# Altium footprint library PCBLIB.PcbLib: 775 footprints (part 27 of 49)
Each footprint in its own frame and in the unit in brackets; x right, y up, seen from the top. Pads: shape width x height; smd on the part's side, far side on the other; paste and mask are expansions set on the pad; w line width, h text height; cw(c..) or ccw(c..) is an arc to the next point about the centre after c.
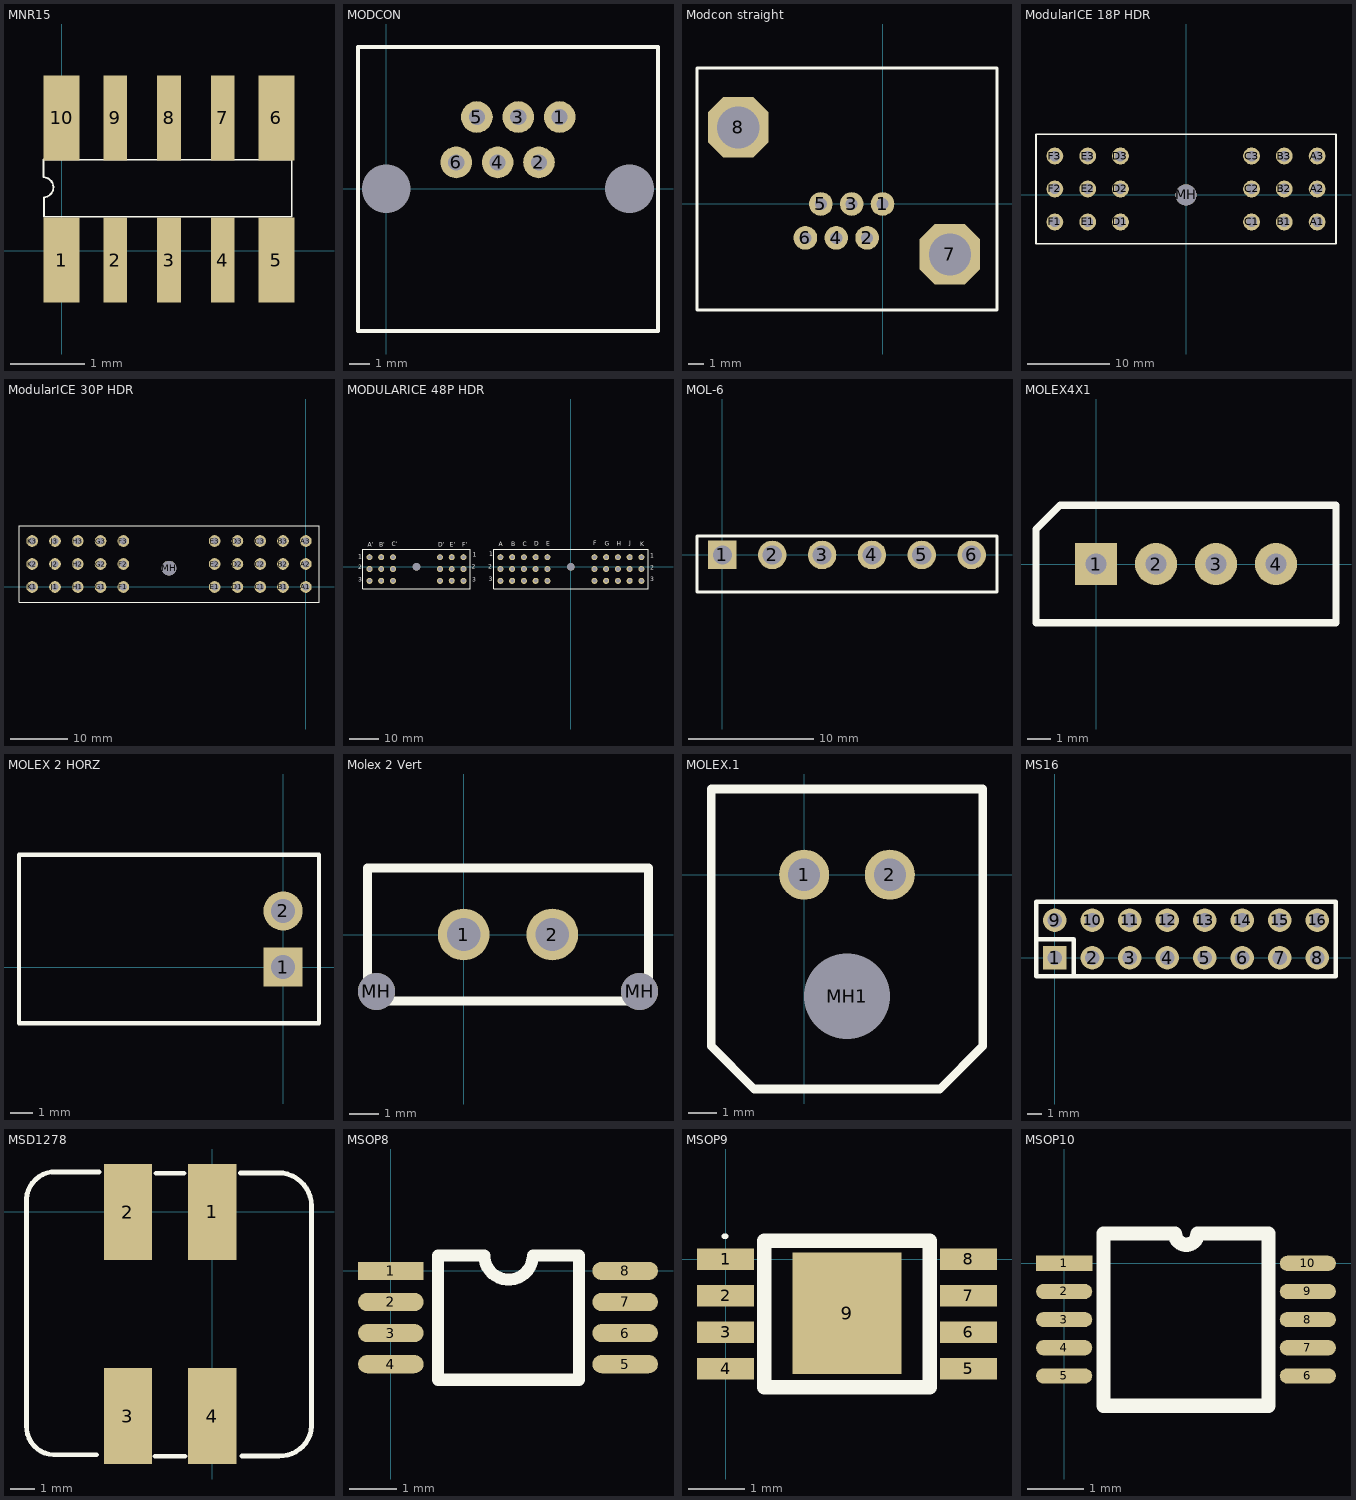
[diagram p26: the footprints below, top view; thin cyan lines are the x and y axes]

## MNR15 [mil]
pads (10):
  rect 18.9x45 smd: 1(0,-5) 5(113.38,-5) 6(113.38,70) 10(0,70)
  rect 12.6x45 smd: 2(28.35,-5) 3(56.69,-5) 4(85.04,-5) 7(85.04,70) 8(56.69,70) 9(28.35,70)
TopOverlay:
  lines w1: -9.56,47.96 121.44,47.96 ; -9.54,47.99 -9.54,38.74 cw(c-9.7,33.4) -9.27,28.08 ; -9.28,28.09 -9.27,17.85 100.81,17.86 ; 99.17,17.87 121.5,17.87 121.48,47.99

## MODCON [mm]
pads (8):
  rect 0x0 hole 2.4: 0(0,0) 0(12,0)
  round 1.562 hole 0.8: 1(8.55,3.54) 2(7.53,1.3) 3(6.51,3.54) 4(5.49,1.3) 5(4.47,3.54) 6(3.45,1.3)
TopOverlay:
  lines w0.203: -1.397,-7.01 -1.397,6.99 13.403,6.99 13.403,-7.01 -1.397,-7.01

## Modcon straight [mm]
pads (8):
  round 1.562 hole 0.8: 1(0,0) 2(-1.02,-2.24) 3(-2.04,0) 4(-3.06,-2.24) 5(-4.08,0) 6(-5.1,-2.24)
  oct 4x4 hole 2.8: 7(4.46,-3.34) 8(-9.54,5.06)
TopOverlay:
  lines w0.203: -12.268,-7.01 -12.268,8.992 7.569,8.992 7.569,-7.01 -12.268,-7.01

## ModularICE 18P HDR [mil]
pads (19):
  round 80 hole 50: A1(623.99,-129) A2(623.99,28.01) A3(623.99,185.02) B1(468.01,-129) B2(468.01,28.01) B3(468.01,185.02) C1(311.98,-129) C2(311.98,28.01) C3(311.98,185.02) D1(-311.99,-129) D2(-311.99,28.01) D3(-311.99,185.02) E1(-468.02,-129) E3(-468.02,185.02) F1(-624,-129) F2(-624,28.01) F3(-624,185.02)
  round 80 hole 50 mask+4.02: E2(-468.02,28.01)
  round 100 hole 100: MH(0,0)
TopOverlay:
  lines w7.99: 713.99,-233.02 713.99,288.99
  lines w8: 713.99,-233 -714,-233 -714,289 713.99,289

## ModularICE 30P HDR [mil]
pads (31):
  round 80 hole 50: A1(0,0) A2(0,157) A3(0,314) B1(-156,0) B2(-156,157) B3(-156,314) C1(-312,0) C2(-312,157) C3(-312,314) D1(-468,0) D2(-468,157) D3(-468,314) E1(-624,0) E2(-624,157) E3(-624,314) F1(-1248,0) F2(-1248,157) F3(-1248,314) G1(-1404,0) G3(-1404,314) H1(-1560,0) H2(-1560,157) H3(-1560,314) J1(-1716,0) J2(-1716,157) J3(-1716,314) K1(-1872,0) K2(-1872,157) K3(-1872,314)
  round 80 hole 50 mask+4: G2(-1404,157)
  round 100 hole 100: MH(-936,129)
TopOverlay:
  lines w8: -1962,-104 -1962,418 90,418 90,-104 -1962,-104

## MODULARICE 48P HDR [mil]
pads (50):
  round 80 hole 50: A1(-936,129.02) A2(-936,-27.99) A3(-936,-185) A'1(-2674.01,129.02) A'2(-2674.01,-27.99) A'3(-2674.01,-185) B1(-780,129.02) B2(-780,-27.99) B3(-780,-185) B'1(-2518.02,129.02) B'3(-2518.02,-185) C1(-624,129.02) C2(-624,-27.99) C3(-624,-185) C'1(-2362,129.02) C'2(-2362,-27.99) C'3(-2362,-185) D1(-468,129.02) D3(-468,-185) D'1(-1738,129.02) D'2(-1738,-27.99) D'3(-1738,-185) E1(-312,129.02) E2(-312,-27.99) E3(-312,-185) E'1(-1581.98,129.02) E'2(-1581.98,-27.99) E'3(-1581.98,-185) F1(312,129.02) F2(312,-27.99) F3(312,-185) F'1(-1425.99,129.02) F'2(-1425.99,-27.99) F'3(-1425.99,-185) G1(468,129.02) G2(468,-27.99) G3(468,-185) H1(624,129.02) H2(624,-27.99) H3(624,-185) J1(780,129.02) J2(780,-27.99) J3(780,-185) K1(936,129.02) K2(936,-27.99) K3(936,-185)
  round 80 hole 50 mask+4.02: B'2(-2518.02,-27.99)
  round 80 hole 50 mask+4: D2(-468,-27.99)
  round 100 hole 100: MH(-2050,0) MH(0,0)
TopOverlay:
  lines w7.99: -1336.01,-289.02 -1336.01,232.99
  lines w8: -1336.01,-289 -2764,-289 -2764,233 -1336.01,233 ; -1026,-289 -1026,233 1026,233 1026,-289 -1026,-289
  text "3" at 1054.32,-213.19 h100
  text "3" at -1092.43,-211.13 h100
  text "3" at -1311.33,-215.35 h100
  text "3" at -2826.51,-215.41 h100
  text "1" at -1303.16,114.31 h100
  text "1" at -1086.27,118.48 h100
  text "1" at 1056.37,101.47 h100
  text "2" at 1054.38,-56.69 h100
  text "2" at -1094.49,-43.96 h100
  text "2" at -1313.44,-41.85 h100
  text "2" at -2822.17,-48.41 h100
  text "1" at -2820.29,86.91 h100
  text "A" at -954.58,253.82 h100
  text "B" at -792.03,253.87 h100
  text "C" at -639.93,255.93 h100
  text "D" at -483.71,260.09 h100
  text "E" at -327.21,260.15 h100
  text "F" at 299.88,266.54 h100
  text "G" at 450.27,260.15 h100
  text "H" at 608.48,262.2 h100
  text "J" at 773.09,266.49 h100
  text "K" at 919.26,253.76 h100
  text "F'" at -1445.14,247.42 h100
  text "E'" at -1607.5,245.37 h100
  text "D'" at -1763.69,245.37 h100
  text "C'" at -2378.2,253.59 h100
  text "B'" at -2544.67,249.48 h100
  text "A'" at -2694.7,249.48 h100
BottomOverlay:
  text "1" at 1070.79,97.47 h100
  text "2" at 1081.12,-46.3 h100
  text "2" at -1289.57,-40.8 h100
  text "2" at -1067.57,-45.02 h100
  text "2" at -2795.42,-50.35 h100
  text "1" at -2805.87,99.36 h100
  text "1" at -1075.79,117.42 h100
  text "1" at -1299.84,115.36 h100
  text "3" at 1074.9,-204.86 h100
  text "3" at -1287.46,-214.3 h100
  text "3" at -1069.63,-212.19 h100
  text "3" at -2805.93,-215.3 h100
  text "A'" at -2651.55,249.81 h100
  text "B'" at -2514.3,249.81 h100
  text "C'" at -2333.75,255.09 h100
  text "D" at -1729.82,244.53 h100
  text "E'" at -1567.22,245.59 h100
  text "F'" at -1413.07,247.7 h100
  text "K" at 917.15,301.9 h100
  text "J" at 770.98,318.74 h100
  text "H" at 606.37,310.35 h100
  text "G" at 448.16,312.4 h100
  text "F" at 297.77,322.9 h100
  text "E" at -329.32,312.4 h100
  text "D" at -485.82,308.24 h100
  text "C" at -642.04,308.18 h100
  text "B" at -794.14,310.24 h100
  text "A" at -910.5,254.03 h100

## MOL-6 [mil]
pads (6):
  rect 90x90 hole 60: 1(0,0)
  round 90 hole 60: 2(157,0) 3(314,0) 4(471,0) 5(628,0) 6(785,0)
TopOverlay:
  lines w10: -80,-117 865,-117 865,60 -80,60 -80,-117

## MOLEX4X1 [mil]
pads (4):
  rect 70x70 hole 35: 1(0,0)
  round 70 hole 35: 2(100,0) 3(200,0) 4(300,0)
TopOverlay:
  lines w12: -100,-98 400,-98 400,98 -60,98 -100,58 -100,31 -100,-98
Mechanical4:
  text ".065" at 0,0 h1

## MOLEX 2 HORZ [mil]
pads (2):
  rect 70x70 hole 43: 1(0,0)
  round 70 hole 43: 2(0,100)
TopOverlay:
  lines w8: -471,-100 64,-100 64,200 -471,200 -471,-100

## Molex 2 Vert [mil]
pads (4):
  round 70 hole 45: 1(0,0) 2(120,0)
  round 50 hole 50: MH(-118,-77) MH(238,-77)
TopOverlay:
  lines w12: -130,-90 -130,90 250,90 250,-90 -130,-90
  text "." at -115,-122 h30
Mechanical4:
  text "0.175" at 0,0 h1

## MOLEX.1 [mil]
pads (3):
  round 70 hole 45: 1(0,0) 2(120,0)
  round 70 hole 120: MH1(60,-170)
TopOverlay:
  lines w12: -130,-240 -70,-300 190,-300 250,-240 250,120 -130,120 -130,-240
Mechanical4:
  text "0.175" at 0,0 h1

## MS16 [mil]
pads (16):
  rect 62x62 hole 38: 1(0,0)
  round 62 hole 38: 2(100,0) 3(200,0) 4(300,0) 5(400,0) 6(500,0) 7(600,0) 8(700,0) 9(0,100) 10(100,100) 11(200,100) 12(300,100) 13(400,100) 14(500,100) 15(600,100) 16(700,100)
TopOverlay:
  lines w12: -50,50 50,50 50,-50 ; -50,-50 -50,150 750,150 750,-50 -50,-50

## MSD1278 [mil]
height 317
pads (4):
  rect 79x157 smd: 1(0,0) 2(-138,-0.22) 3(-138,-334) 4(0,-334)
TopOverlay:
  lines w8: -189.7,-397.34 -260.01,-397.34 cw(c-258.41,-351.91) -303.85,-350.32 -304.2,-349.97 -304.2,21.39 cw(c-256.14,17.99) -262.85,65.7 -184.87,65.7 ; -94,-399.76 -44.76,-399.76 ; -91.79,63.29 -46.37,63.29 ; 46.08,63.69 115.62,63.69 cw(c107.29,8.91) 162.69,9.97 162.69,-350.1 cw(c111.32,-347.78) 109,-399.15 48.71,-399.15
  text "." at -8.83,95.71 h60

## MSOP8 [mil]
pads (8):
  rect 54x15 smd: 1(0,0)
  oval 54x15 smd: 2(0,-25.6) 3(0,-51.2) 4(0,-76.8) 5(193,-76.8) 6(193,-51.2) 7(193,-25.6) 8(193,0)
TopOverlay:
  lines w10: 39,-89.6 155,-89.6 155,12.8 117,12.8 cw(c97,12.8) 77,12.8 70,12.8 39,12.8 39,-89.6
Mechanical4:
  text ".040" at 0,0 h1

## MSOP9 [mil]
height 393.7
pads (9):
  rect 40x14.96 smd: 1(0,0) 2(0,-25.59) 3(0,-51.18) 4(0,-76.77) 5(170,-76.77) 6(170,-51.18) 7(170,-25.59) 8(170,0)
  rect 76.06x85.12 smd: 9(85,-38)
TopOverlay:
  lines w3.94: -1,16 0,16
  lines w10: 27,-89.6 27,12.8 58,12.8 65,12.8 105,12.8 143,12.8 143,-89.6 27,-89.6
Mechanical4:
  text ".040" at -12,0 h1

## MSOP10 [mm]
height 1.397
pads (10):
  rect 1x0.27 smd: 1(0,0)
  oval 1x0.27 smd: 2(0,-0.5) 3(0,-1) 4(0,-1.5) 5(0,-2) 6(4.33,-2) 7(4.33,-1.5) 8(4.33,-1) 9(4.33,-0.5) 10(4.33,0)
TopOverlay:
  lines w0.254: 0.7,-2.53 0.7,0.53 1.97,0.53 ccw(c2.17,0.53) 2.37,0.53 3.63,0.53 3.63,-2.53 0.7,-2.53
Mechanical4:
  text ".040" at 0,0 h0.03